# Altium footprint library Footprints.PcbLib: 135 footprints (part 7 of 9)
Each footprint in its own frame and in the unit in brackets; x right, y up, seen from the top. Pads: shape width x height; smd on the part's side, far side on the other; paste and mask are expansions set on the pad; w line width, h text height; cw(c..) or ccw(c..) is an arc to the next point about the centre after c.
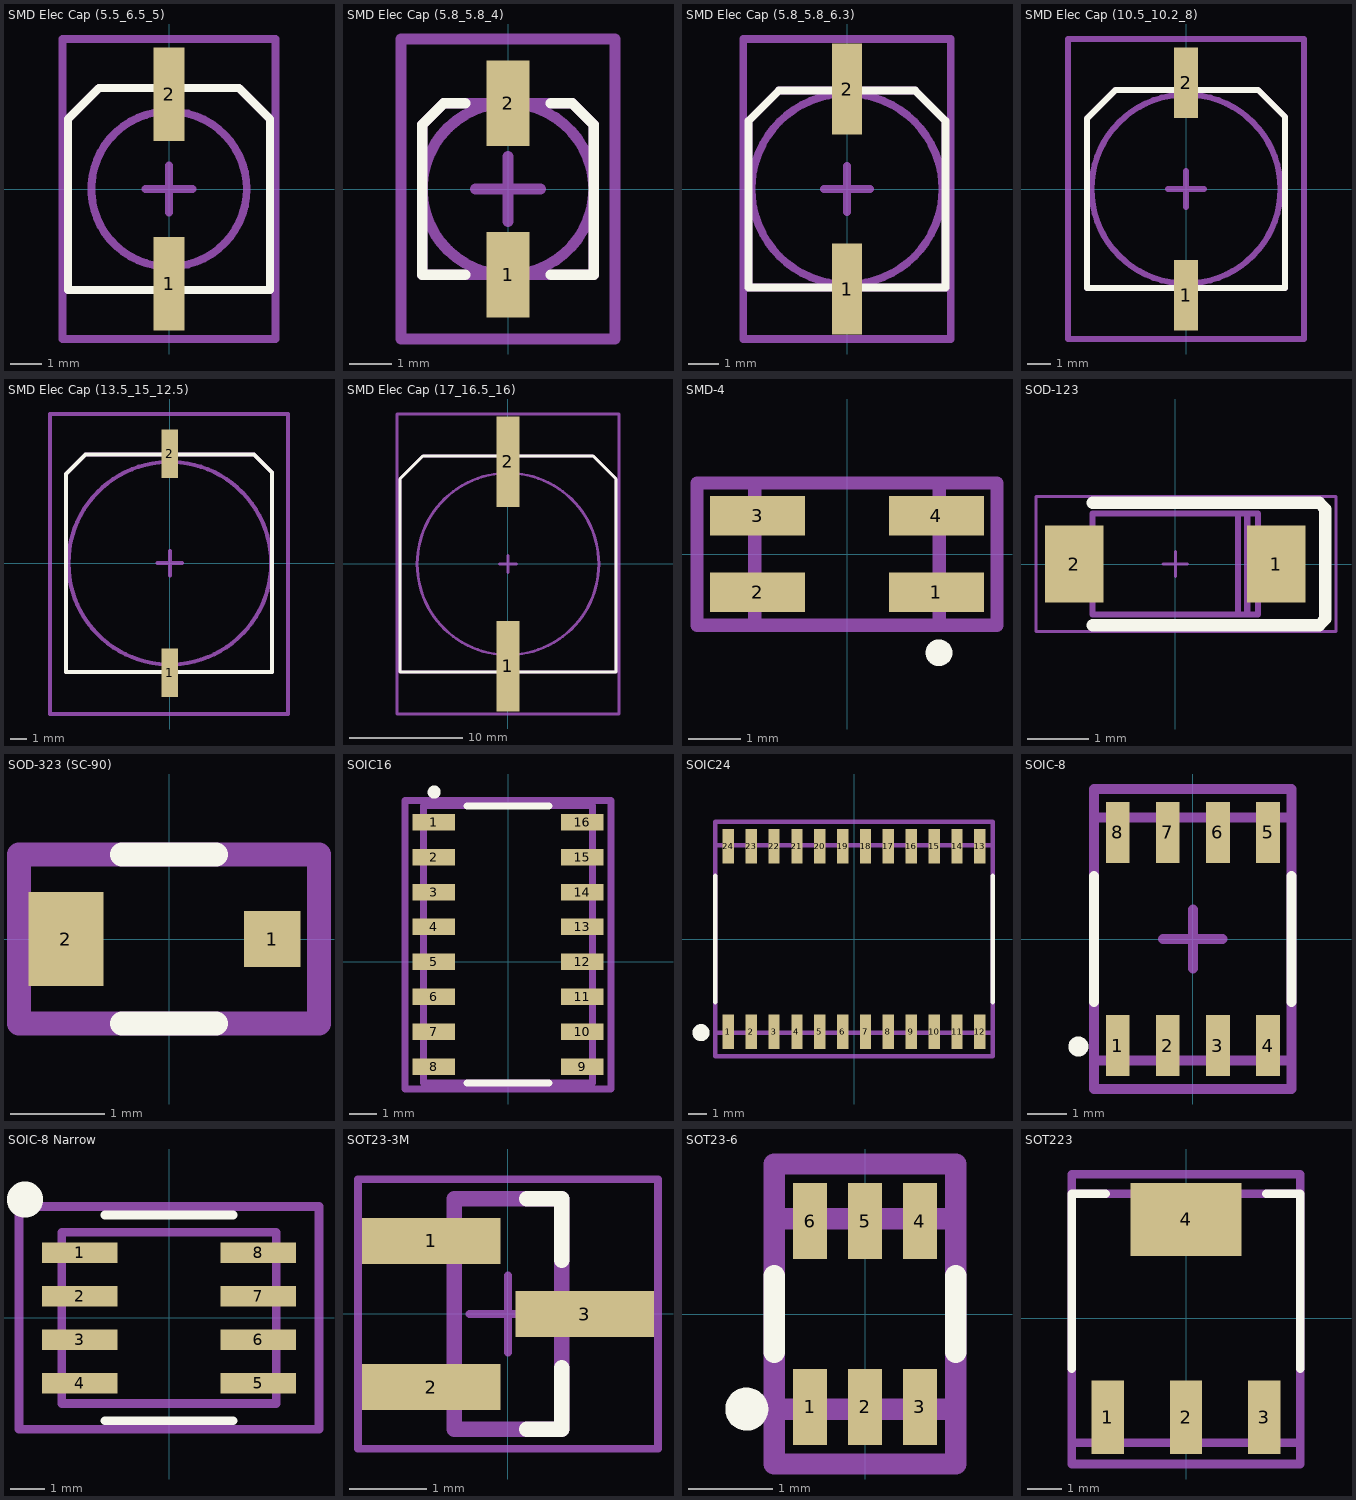
[diagram p6: the footprints below, top view; thin cyan lines are the x and y axes]

## SMD Elec Cap (5.5_6.5_5) [mm] "L=5.5mm, H=6.5mm, D=5mm"
height 5.8
pads (2):
  rect 1x3 smd mask+0.102: 1(0,-3.048) 2(0,3.048)
Top Overlay:
  lines w0.254: -3.25,-3.25 3.25,-3.25 3.25,2.25 2.25,3.25 -2.25,3.25 -3.25,2.25 -3.25,-3.25
Mechanical 13:
  circle w0.254: c0,0 r2.5
  lines w0.254: 2.211,3.25 -2.25,3.25 -3.25,2.25 -3.25,-3.25 3.25,-3.25 3.25,2.211 ; 2.25,3.25 3.25,2.25
Mechanical 15:
  lines w0.254: -0.762,0 0.762,0 ; 0,-0.762 0,0.762 ; -3.429,-4.826 -3.429,4.826 3.429,4.826 3.429,-4.826 -3.429,-4.826
3D body: height 5.8, standoff 0, extent -2.48,-2.495 2.5,2.495
3D body: height 2, standoff 0, extent -3.302,-3.302 3.302,3.302

## SMD Elec Cap (5.8_5.8_4) [mm] "L=5.8mm, H=5.8mm, D=4mm"
height 5.8
pads (2):
  rect 1x2 smd mask+0.102: 1(0,-2) 2(0,2)
Top Overlay:
  lines w0.254: -1,-2 -2,-2 -2,1 -2,1.5 -1.5,2 -1,2 ; 1,-2 2,-2 2,1 2,1.5 1.5,2 1,2
Mechanical 13:
  circle w0.254: c0,0 r2
  lines w0.254: -2,-2 2,-2 2,1.5 1.5,2 -1.5,2 -2,1.5 -2,-2
Mechanical 15:
  lines w0.254: -0.762,0 0.762,0 ; 0,-0.762 0,0.762 ; -2.5,-3.5 -2.5,3.5 2.5,3.5 2.5,-3.5 -2.5,-3.5
3D body: height 5.51, standoff 5.4, extent -1.5,-1.25 1.5,-0.75
3D body: height 5.5, standoff 0.5, extent -1.984,-1.996 2,1.996
3D body: height 1, standoff 0, extent -2,-2 2,2

## SMD Elec Cap (5.8_5.8_6.3) [mm] "L=5.8mm, H=5.8mm, D=6.3mm"
height 5.8
pads (2):
  rect 1x3 smd mask+0.102: 1(0,-3.302) 2(0,3.302)
Top Overlay:
  lines w0.254: -3.25,-3.25 3.25,-3.25 3.25,2.25 2.25,3.25 -2.25,3.25 -3.25,2.25 -3.25,-3.25
Mechanical 13:
  circle w0.254: c0,0 r3.15
  lines w0.254: 2.211,3.25 -2.25,3.25 -3.25,2.25 -3.25,-3.25 3.25,-3.25 3.25,2.211 ; 2.25,3.25 3.25,2.25
Mechanical 15:
  lines w0.254: -0.762,0 0.762,0 ; 0,-0.762 0,0.762 ; -3.429,-4.953 -3.429,4.953 3.429,4.953 3.429,-4.953 -3.429,-4.953
3D body: height 5.8, standoff 0, extent -3.125,-3.144 3.15,3.144
3D body: height 2, standoff 0, extent -3.302,-3.302 3.302,3.302

## SMD Elec Cap (10.5_10.2_8) [mm] "L=10.5mm, H=10.2mm, D=8mm"
height 8
pads (2):
  rect 1x3 smd mask+0.102: 1(0,-4.5) 2(0,4.5)
Top Overlay:
  lines w0.254: -4.2,-4.2 4.2,-4.2 4.2,3.05 3.05,4.2 -2.975,4.2 -4.2,2.975 -4.2,-4.2
Mechanical 13:
  circle w0.254: c0,0 r4
  lines w0.254: -4.2,-4.2 4.2,-4.2 4.2,3.05 3.05,4.2 -2.975,4.2 -4.2,2.975 -4.2,-4.2
Mechanical 15:
  lines w0.254: -0.762,0 0.762,0 ; 0,-0.762 0,0.762 ; -5,-6.35 -5,6.35 5,6.35 5,-6.35 -5,-6.35
3D body: height 1.5, standoff 0, extent -4.2,-4.2 4.2,4.2
3D body: height 8, standoff 0, extent -3.968,-3.992 4,3.992

## SMD Elec Cap (13.5_15_12.5) [mm] "L=13.5mm, H=15mm, D=12.5mm"
height 15
pads (2):
  rect 1x3 smd mask+0.102: 1(0,-6.75) 2(0,6.75)
Top Overlay:
  lines w0.254: -6.4,-6.7 6.3,-6.7 6.3,5.6 5.2,6.7 -5.2,6.7 -6.4,5.5 -6.4,-6.7
Mechanical 13:
  circle w0.254: c0,0 r6.25
  lines w0.254: -6.4,-6.7 6.3,-6.7 6.3,5.6 5.2,6.7 -5.2,6.7 -6.4,5.5 -6.4,-6.7
Mechanical 15:
  lines w0.254: -0.762,0 0.762,0 ; 0,-0.762 0,0.762 ; -7.4,-9.3 -7.4,9.2 7.3,9.2 7.3,-9.3 -7.4,-9.3
3D body: height 1.5, standoff 0, extent -6.35,-6.7 6.35,6.7
3D body: height 15, standoff 0, extent -6.25,-6.25 6.25,6.25

## SMD Elec Cap (17_16.5_16) [mm] "L=17mm, H=16.5mm, D=16mm"
height 17
pads (2):
  rect 2x8 smd mask+0.102: 1(0,-9) 2(0,9)
Top Overlay:
  lines w0.254: -9.5,-9.5 -9.5,7.5 -7.5,9.5 7.5,9.5 9.5,7.5 9.5,-9.5 -9.5,-9.5
Mechanical 13:
  circle w0.254: c0,0 r8
  lines w0.254: -9.5,-9.5 -9.5,7.5 -7.5,9.5 7.5,9.5 9.5,7.5 9.5,-9.5 -9.5,-9.5
Mechanical 15:
  lines w0.254: -0.762,0 0.762,0 ; 0,-0.762 0,0.762 ; -9.779,-13.208 9.779,-13.208 9.779,13.208 -9.779,13.208 -9.779,-13.208
3D body: height 2, standoff 0, extent -9.525,-9.525 9.525,9.525
3D body: height 16.5, standoff 0, extent -7.937,-7.984 8,7.984

## SMD-4 [mm] "RGB LED Package"
height 0.4
pads (4):
  rect 1.8x0.75 smd mask+0.102: 1(1.7,-0.725) 2(-1.7,-0.725) 3(-1.7,0.725) 4(1.7,0.725)
Top Overlay:
  circle w0.254: c1.748,-1.875 r0.127
Mechanical 13:
  lines w0.254: -1.75,-1.35 1.75,-1.35 1.75,1.35 -1.75,1.35 -1.75,-1.35
Mechanical 15:
  lines w0.254: -2.85,-1.35 2.85,-1.35 2.85,1.35 -2.85,1.35 -2.85,-1.35
3D body: height 1.87, standoff -0.03, extent -1.75,-1.4 1.75,1.4

## SOD-123 [mm] "SM DIODE; 2 Flat Leads"
height 1
pads (2):
  rect 0.95x1.25 smd: 1(1.65,0) 2(-1.65,0)
Top Overlay:
  lines w0.2: -1.35,-1 2.35,-1 2.45,-0.9 2.45,0.9 2.35,1 -1.35,1
Mechanical 13:
  lines w0.1: 1.025,0.825 1.025,-0.825 1.175,-0.825 1.175,0.825 ; -1.35,-0.825 -1.35,0.825 1.35,0.825 1.35,-0.825 -1.35,-0.825
Mechanical 15:
  lines w0.05: -0.2,0 0.2,0 ; 0,-0.2 0,0.2 ; -2.275,-1.1 2.625,-1.1 2.625,1.1 -2.275,1.1 -2.275,-1.1
3D body: height 1.35, standoff 0, extent -1.925,-1.076 1.925,1.077

## SOD-323 (SC-90) [mm]
height 0.8
pads (2):
  rect 0.6x0.6 smd mask+0.102: 1(1.1,0)
  rect 0.8x1 smd mask+0.102: 2(-1.1,0)
Top Overlay:
  lines w0.254: -0.5,-0.9 0.5,-0.9 ; -0.5,0.9 0.5,0.9
Mechanical 13:
  lines w0.254: -1.6,-0.9 1.6,-0.9 1.6,0.9 -1.6,0.9 -1.6,-0.9
Mechanical 15:
  lines w0.254: -1.6,-0.9 1.6,-0.9 1.6,0.9 -1.6,0.9 -1.6,-0.9
3D body: height 1.1, standoff 0, extent -1.325,-0.675 1.275,0.675

## SOIC16 [mm] "1.27mm Pitch"
height 1.75
pads (16):
  rect 1.55x0.6 smd mask+0.102: 1(-2.7,5.08) 2(-2.7,3.81) 3(-2.7,2.54) 4(-2.7,1.27) 5(-2.7,0) 6(-2.7,-1.27) 7(-2.7,-2.54) 8(-2.7,-3.81) 9(2.7,-3.81) 10(2.7,-2.54) 11(2.7,-1.27) 12(2.7,0) 13(2.7,1.27) 14(2.7,2.54) 15(2.7,3.81) 16(2.7,5.08)
Top Overlay:
  circle w0.254: c-2.687,6.175 r0.112
  lines w0.254: -1.5,-4.4 1.5,-4.4 ; -1.5,5.675 1.5,5.675
Mechanical 1:
  lines w0.254: -3.082,-4.4 -3.082,5.68 3.082,5.68 3.082,-4.4 -3.082,-4.4
Mechanical 15:
  lines w0.254: -3.75,-4.625 -3.75,5.875 3.75,5.875 3.75,-4.625 -3.75,-4.625
3D body: height 2, standoff 0, extent -3.082,-4.4 3.082,5.68

## SOIC24 [mm]
height 2.65
pads (24):
  rect 0.63x1.9 smd mask+0.102: 1(-6.985,-5.15) 2(-5.715,-5.15) 3(-4.445,-5.15) 4(-3.175,-5.15) 5(-1.905,-5.15) 6(-0.635,-5.15) 7(0.635,-5.15) 8(1.905,-5.15) 9(3.175,-5.15) 10(4.445,-5.15) 11(5.715,-5.15) 12(6.985,-5.15) 13(6.985,5.15) 14(5.715,5.15) 15(4.445,5.15) 16(3.175,5.15) 17(1.905,5.15) 18(0.635,5.15) 19(-0.635,5.15) 20(-1.905,5.15) 21(-3.175,5.15) 22(-4.445,5.15) 23(-5.715,5.15) 24(-6.985,5.15)
Top Overlay:
  circle w0.5: c-8.5,-5.2 r0.224
  lines w0.254: -7.7,-3.5 -7.7,3.5 ; 7.7,-3.5 7.7,3.5
Mechanical 13:
  lines w0.254: -7.7,-5.2 -7.7,5.2 7.7,5.2 7.7,-5.2 -7.7,-5.2
Mechanical 15:
  lines w0.254: -7.7,-6.5 -7.7,6.5 7.7,6.5 7.7,-6.5 -7.7,-6.5
3D body: height 2.65, standoff 0, extent -7.75,-5.15 7.75,5.15

## SOIC-8 [mm]
height 1.4
pads (8):
  rect 0.6x1.55 smd mask+0.102: 1(-1.905,-2.7) 2(-0.635,-2.7) 3(0.635,-2.7) 4(1.905,-2.7) 5(1.905,2.7) 6(0.635,2.7) 7(-0.635,2.7) 8(-1.905,2.7)
Top Overlay:
  circle w0.254: c-2.9,-2.725 r0.127
  lines w0.254: -2.5,-1.6 -2.5,1.6 ; 2.5,-1.6 2.5,1.6
Mechanical 13:
  lines w0.254: 2.5,3.081 2.5,-3.075 2.5,-3.075 -2.5,-3.075 -2.5,3.075 2.5,3.075
Mechanical 15:
  lines w0.254: -0.75,0 0.75,0 ; 0,-0.75 0,0.75 ; -2.5,-3.8 2.5,-3.8 2.5,3.8 -2.5,3.8 -2.5,-3.8
3D body: height 2, standoff 0, extent -2.5,-3.082 2.5,3.081

## SOIC-8 Narrow [mm]
height 1.25
pads (8):
  rect 2.2x0.6 smd: 1(-2.6,1.905) 2(-2.6,0.635) 3(-2.6,-0.635) 4(-2.6,-1.905) 5(2.6,-1.905) 6(2.6,-0.635) 7(2.6,0.635) 8(2.6,1.905)
Top Overlay:
  circle w1: c-4.2,3.45 r0.025
  lines w0.254: -1.875,-3 1.875,-3 ; -1.875,3 1.875,3
Mechanical 13:
  lines w0.254: -3.125,-2.5 3.125,-2.5 3.125,2.5 -3.125,2.5 -3.125,-2.5
Mechanical 15:
  lines w0.254: -4.375,-3.25 4.375,-3.25 4.375,3.25 -4.375,3.25 -4.375,-3.25
3D body: height 1.75, standoff 0, extent -3.122,-2.5 3.122,2.5

## SOT23-3M [mm]
pads (3):
  rect 1.8x0.6 smd: 1(-0.994,0.946) 2(-0.994,-0.954) 3(1.006,-0.004)
Top Overlay:
  lines w0.2: 0.25,-1.504 0.706,-1.504 0.706,-0.704 ; 0.25,1.496 0.706,1.496 0.706,0.696
Mechanical 11:
  lines w0.001: -0.694,-1.504 0.706,-1.504 0.706,1.496 -0.694,1.496 -0.694,-1.504
Mechanical 13:
  lines w0.2: -0.694,-1.504 0.706,-1.504 0.706,1.496 -0.694,1.496 -0.694,-1.504
Mechanical 15:
  lines w0.1: -0.494,-0.004 0.506,-0.004 ; 0.006,-0.504 0.006,0.496 ; -1.944,-1.754 1.956,-1.754 1.956,1.746 -1.944,1.746 -1.944,-1.754
3D body: height 1.18, standoff -0.04, extent -1.126,-1.5 1.126,1.5

## SOT23-6 [mm] "0.65mm pitch"
height 1.1
pads (6):
  rect 0.4x0.9 smd mask+0.102: 1(-0.65,-1.1) 2(0,-1.1) 3(0.65,-1.1) 4(0.65,1.1) 5(0,1.1) 6(-0.65,1.1)
Top Overlay:
  circle w0.254: c-1.4,-1.125 r0.127
  lines w0.254: -1.075,-0.45 -1.075,0.45 ; 1.075,-0.45 1.075,0.45
Mechanical 13:
  lines w0.254: -1.075,-1.125 -1.075,1.125 1.075,1.125 1.075,-1.125 -1.075,-1.125
Mechanical 15:
  lines w0.254: -1.075,-1.775 1.075,-1.775 1.075,1.775 -1.075,1.775 -1.075,-1.775
3D body: height 1.1, standoff -0.01, extent -1.125,-1.125 1.125,1.125

## SOT223 [mm]
height 1.8
pads (4):
  rect 0.95x2.15 smd mask+0.102: 1(-2.3,-2.9) 2(0,-2.9) 3(2.3,-2.9)
  rect 3.25x2.15 smd mask+0.102: 4(0,2.9)
Top Overlay:
  lines w0.254: -3.35,-1.475 -3.35,3.65 -2.35,3.65 ; 2.35,3.65 3.35,3.65 3.35,-1.475
Mechanical 13:
  lines w0.254: -3.35,-3.65 -3.35,3.65 3.35,3.65 3.35,-3.65 -3.35,-3.65
Mechanical 15:
  lines w0.254: -3.35,-4.275 -3.35,4.225 3.35,4.225 3.35,-4.275 -3.35,-4.275
3D body: height 1.65, standoff 0, extent -3.275,-3.543 3.225,3.544